# Altium footprint library Miscellaneous Devices.PcbLib: 277 footprints (part 10 of 18)
Each footprint in its own frame and in the unit in brackets; x right, y up, seen from the top. Pads: shape width x height; smd on the part's side, far side on the other; paste and mask are expansions set on the pad; w line width, h text height; cw(c..) or ccw(c..) is an arc to the next point about the centre after c.
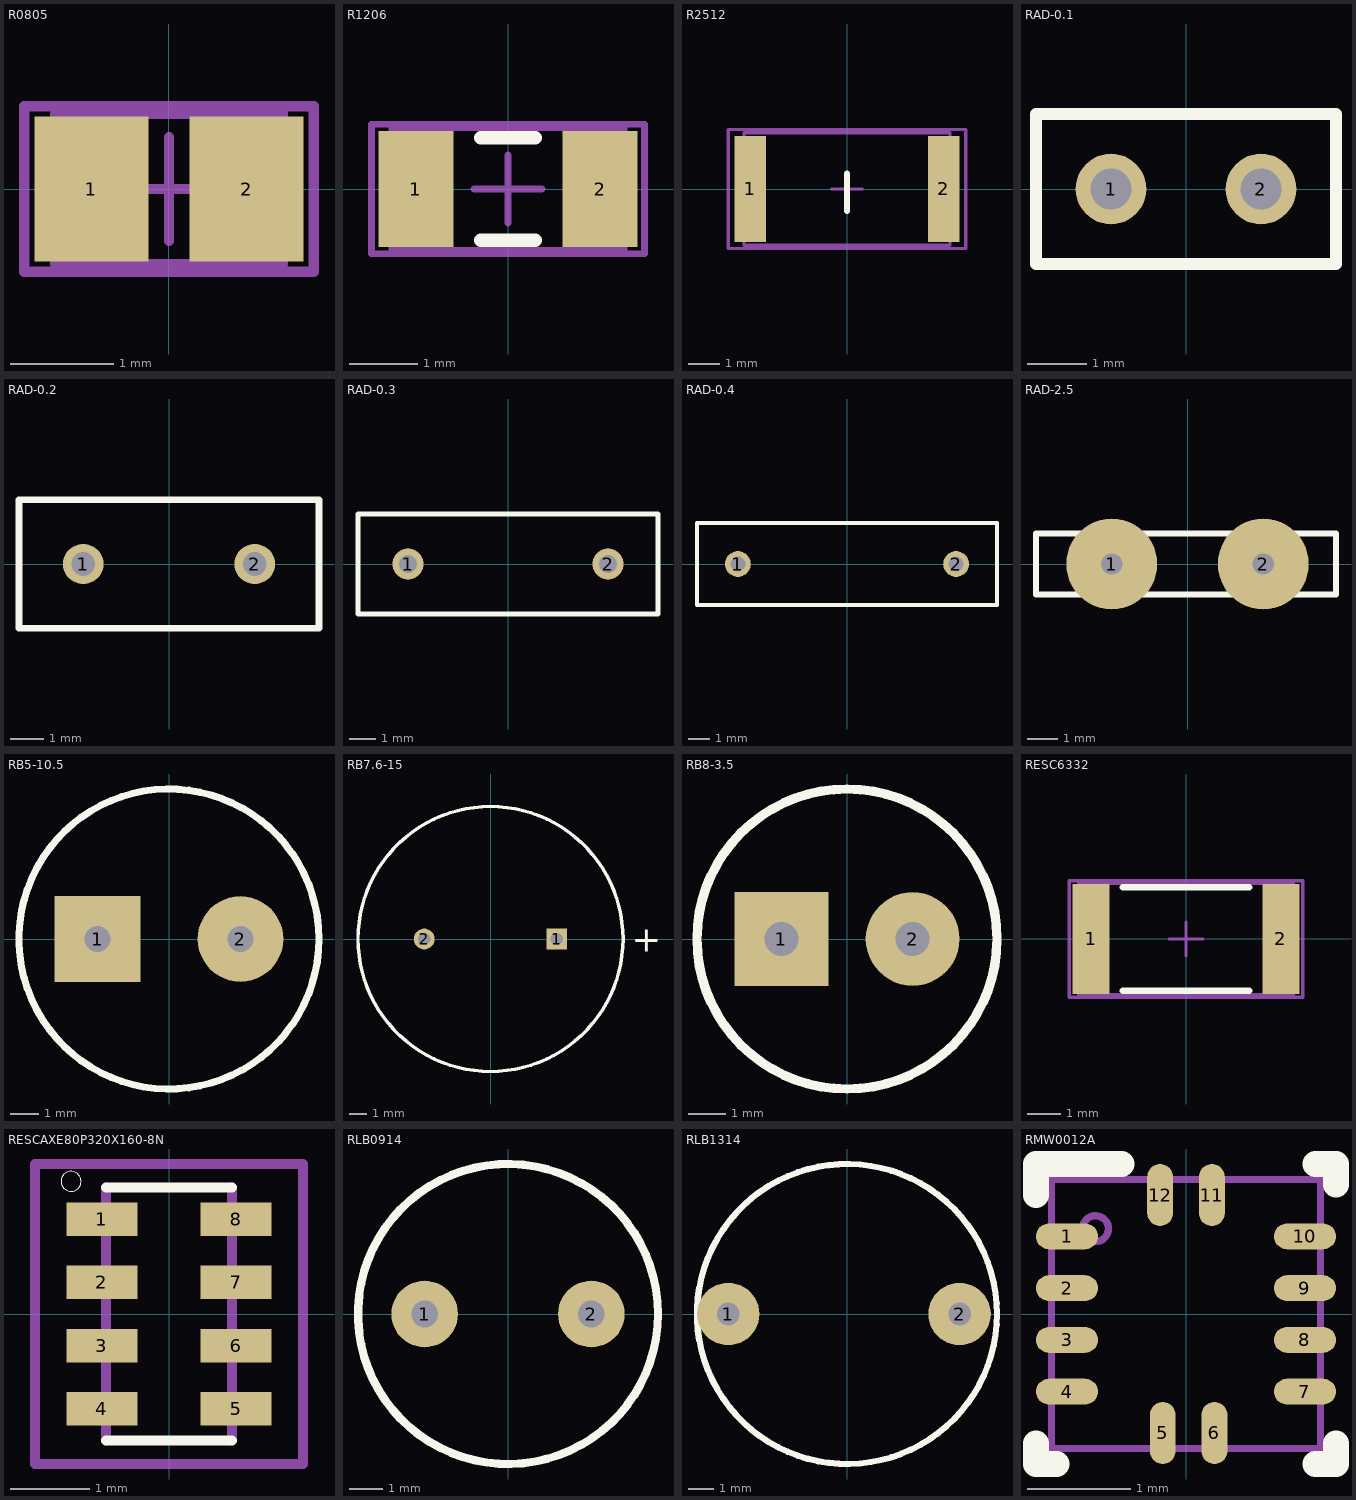
[diagram p9: the footprints below, top view; thin cyan lines are the x and y axes]

## R0805 [mm] "Chip Resistor"
height 1.4
pads (2):
  rect 1.1x1.4 smd: 1(-0.75,0) 2(0.75,0)
Mechanical 13:
  lines w0.1: -1.1,-0.725 1.1,-0.725 1.1,0.725 -1.1,0.725 -1.1,-0.725
Mechanical 15:
  lines w0.1: -0.5,0 0.5,0 ; 0,-0.5 0,0.5 ; -1.4,-0.8 1.4,-0.8 1.4,0.8 -1.4,0.8 -1.4,-0.8
3D body "SW3dPS-0805 SMD Resistor.STEP": height 0.78, standoff 0, extent -1,-0.625 1,0.625

## R1206 [mm] "Chip Resistor"
height 1.3
pads (2):
  rect 1.1x1.7 smd: 1(-1.35,0) 2(1.35,0)
Top Overlay:
  lines w0.2: -0.4,-0.75 0.4,-0.75 ; -0.4,0.75 0.4,0.75
Mechanical 13:
  lines w0.1: -1.7,-0.9 -1.7,0.9 1.7,0.9 1.7,-0.9 -1.7,-0.9
Mechanical 15:
  lines w0.1: -0.5,0 0.5,0 ; 0,-0.5 0,0.5 ; -2,-0.95 -2,0.95 2,0.95 2,-0.95 -2,-0.95
3D body "User Library-R_1206.STEP": height 0.6, standoff 0, extent -1.6,-0.8 1.6,0.8

## R2512 [mm] "Chip Res, Body 2.54x1.27mm, IPC High Density"
height 1.3
pads (2):
  rect 1x3.4 smd: 1(-3.1,0) 2(3.1,0)
Top Overlay:
  lines w0.2: 0,-0.7 0,0.5
Mechanical 13:
  lines w0.1: -3.3,-1.8 -3.3,1.8 3.3,1.8 3.3,-1.8 -3.3,-1.8
Mechanical 15:
  lines w0.1: -0.5,0 0.5,0 ; 0,-0.5 0,0.5 ; -3.8,-1.9 -3.8,1.9 3.8,1.9 3.8,-1.9 -3.8,-1.9
3D body "User Library-R_2512.STEP": height 0.6, standoff 0, extent -3.3,-1.6 3.1,1.6

## RAD-0.1 [mm] "Radial Cap, Thru-Hole; 2 Leads; 0.1 in Pin Spacing"
pads (2):
  round 1.2 hole 0.7: 1(-1.27,0) 2(1.27,0)
Top Overlay:
  lines w0.2: -2.54,-1.27 2.54,-1.27 2.54,1.27 -2.54,1.27 -2.54,-1.27

## RAD-0.2 [mm] "Radial Cap, Thru-Hole; 2 Leads; 0.2 in Pin Spacing"
pads (2):
  round 1.2 hole 0.7: 1(-2.54,0) 2(2.54,0)
Top Overlay:
  lines w0.2: -4.445,-1.905 4.445,-1.905 4.445,1.905 -4.445,1.905 -4.445,-1.905

## RAD-0.3 [mm] "Radial Cap, Thru-Hole; 2 Leads; 0.3 in Pin Spacing"
height 6
pads (2):
  round 1.2 hole 0.7: 1(-3.81,0) 2(3.81,0)
Top Overlay:
  lines w0.2: -5.715,-1.905 5.715,-1.905 5.715,1.905 -5.715,1.905 -5.715,-1.905

## RAD-0.4 [mm] "Radial Cap, Thru-Hole; 2 Leads; 0.4 in Pin Spacing"
pads (2):
  round 1.2 hole 0.7: 1(-5.08,0) 2(5.08,0)
Top Overlay:
  lines w0.2: -6.985,-1.905 6.985,-1.905 6.985,1.905 -6.985,1.905 -6.985,-1.905

## RAD-2.5 [mm] "Radial Cap, Thru-Hole; 2 Leads; 0.4 in Pin Spacing"
pads (2):
  round 3 hole 0.7: 1(-2.5,0) 2(2.5,0)
Top Overlay:
  lines w0.2: -5,-1 -5,1 4.9,1 4.9,-1 -5,-1
Mechanical 13:
  circle w0.254: c2.5,0 r0.361
  circle w0.254: c-2.5,0 r0.361
3D body "User Library-DEBB33A472KA3B.STEP": height 16, standoff -3, extent -6.175,-2.204 5.825,1.775

## RB5-10.5 [mm] "Capacitor (Radial); 2 Leads"
pads (2):
  rect 3x3 hole 0.9: 1(-2.5,0)
  round 3 hole 0.9: 2(2.5,0)
Top Overlay:
  circle w0.25: c0,0 r5.25
Mechanical 1:
  circle w0.02: c0,0 r5.25
3D body "User Library-CAP_Electrolytic_10X14_.STEP": height 14.1, standoff -4.72, extent -5,-5 5,5

## RB7.6-15 [mm] "Polarized Capacitor (Radial); 2 Leads"
pads (2):
  rect 1.2x1.2 hole 0.7: 1(3.81,0)
  round 1.2 hole 0.7: 2(-3.81,0)
Top Overlay:
  circle w0.2: c0,0 r7.62
  text "+" at 8.132,-0.737 h1.5

## RB8-3.5 [mm] "Capacitor (Radial); 2 Leads"
pads (2):
  rect 2.5x2.5 hole 0.9: 1(-1.75,0)
  round 2.5 hole 0.9: 2(1.75,0)
Top Overlay:
  circle w0.25: c0,0 r4
Mechanical 1:
  circle w0.02: c0,0 r4
3D body "User Library-CE_R150_D320_H570.STEP": height 14.4, standoff -2.9, extent -4.1,-4.1 4.1,4.1

## RESC6332 [mm] "Chip Resistor, Body 6.3x3.2mm, IPC High Density"
height 0.9
pads (2):
  rect 1.1x3.3 smd: 1(-2.85,0) 2(2.85,0)
Top Overlay:
  lines w0.2: -1.9,-1.55 1.9,-1.55 ; -1.9,1.55 1.9,1.55
Mechanical 13:
  lines w0.1: -3.225,-1.675 3.225,-1.675 3.225,1.675 -3.225,1.675 -3.225,-1.675
Mechanical 15:
  lines w0.1: -0.5,0 0.5,0 ; 0,-0.5 0,0.5 ; -3.5,-1.75 3.5,-1.75 3.5,1.75 -3.5,1.75 -3.5,-1.75
3D body: height 0.9, standoff 0, extent -3.225,-1.675 3.225,1.675

## RESCAXE80P320X160-8N [mm]
pads (8):
  rect 0.9x0.425 smd paste-25.4 mask-25.4: 1(-0.85,1.2) 2(-0.85,0.4) 3(-0.85,-0.4) 4(-0.85,-1.2) 5(0.85,-1.2) 6(0.85,-0.4) 7(0.85,0.4) 8(0.85,1.2)
Top Overlay:
  circle w0: c-1.24,1.68 r0.127
  lines w0.127: -0.8,-1.6 0.8,-1.6 ; -0.8,1.6 0.8,1.6
Top Paste:
  region: 1.3,0.988 1.3,1.412 0.4,1.412 0.4,0.988
  region: 1.3,0.188 1.3,0.612 0.4,0.612 0.4,0.188
  region: 1.3,-0.612 1.3,-0.188 0.4,-0.188 0.4,-0.612
  region: 1.3,-1.412 1.3,-0.988 0.4,-0.988 0.4,-1.412
  region: -1.3,-0.988 -1.3,-1.412 -0.4,-1.412 -0.4,-0.988
  region: -1.3,-0.188 -1.3,-0.612 -0.4,-0.612 -0.4,-0.188
  region: -1.3,0.612 -1.3,0.188 -0.4,0.188 -0.4,0.612
  region: -1.3,1.412 -1.3,0.988 -0.4,0.988 -0.4,1.412
Top Solder:
  region: 1.4,0.888 1.4,1.512 0.3,1.512 0.3,0.888
  region: 1.4,0.088 1.4,0.712 0.3,0.712 0.3,0.088
  region: 1.4,-0.712 1.4,-0.088 0.3,-0.088 0.3,-0.712
  region: 1.4,-1.512 1.4,-0.888 0.3,-0.888 0.3,-1.512
  region: -1.4,-0.888 -1.4,-1.512 -0.3,-1.512 -0.3,-0.888
  region: -1.4,-0.088 -1.4,-0.712 -0.3,-0.712 -0.3,-0.088
  region: -1.4,0.712 -1.4,0.088 -0.3,0.088 -0.3,0.712
  region: -1.4,1.512 -1.4,0.888 -0.3,0.888 -0.3,1.512
Mechanical 1:
  lines w0.127: -0.8,-1.6 -0.8,1.6 ; 0.8,-1.6 0.8,1.6 ; -1.7,-1.9 1.7,-1.9 1.7,1.9 -1.7,1.9 -1.7,-1.9
3D body "User Library-Array-1206-4Way-Var1.STEP": height 0.5, standoff 0, extent -0.8,-1.6 0.8,1.6

## RLB0914 [mm] "Ind (Radial); 2 Leads"
pads (2):
  round 2 hole 0.8: 1(-2.5,0) 2(2.5,0)
Top Overlay:
  circle w0.25: c0,0 r4.5
3D body "User Library-RLB 0914.STEP": height 12, standoff -25, extent -4.3,-4.3 4.4,4.4

## RLB1314 [mm] "Ind (Radial); 2 Leads"
pads (2):
  round 2.5 hole 0.9: 1(-4.75,0) 2(4.5,0)
Top Overlay:
  circle w0.25: c0,0 r6
3D body "rlb1314-4r7ml.stp": height 13, standoff -20, extent -5.75,-5.85 5.95,5.85

## RMW0012A [mm]
pads (12):
  oval 0.6x0.25 smd paste+0 mask+0.051: 1(-1.15,0.75) 2(-1.15,0.25) 3(-1.15,-0.25) 4(-1.15,-0.75) 7(1.15,-0.75) 8(1.15,-0.25) 9(1.15,0.25) 10(1.15,0.75)
  oval 0.25x0.6 smd paste+0 mask+0.051: 5(-0.225,-1.15) 6(0.275,-1.15) 11(0.25,1.15) 12(-0.25,1.15)
Top Overlay:
  lines w0.25: -1.45,-1.25 -1.45,-1.45 -1.25,-1.45 ; -1.45,1.15 -1.45,1.45 -0.625,1.45 ; 1.25,-1.45 1.45,-1.45 1.45,-1.25 ; 1.25,1.45 1.45,1.45 1.45,1.25
  text ".Designator" at -5.5,-3 h1.27
Mechanical 13:
  circle w0.07: c-0.875,0.825 r0.125
  lines w0.07: -1.3,-1.3 -1.3,1.3 1.3,1.3 1.3,-1.3 -1.3,-1.3
3D body: height 0.25, standoff 0, extent 0,0 0.254,0.254